# Altium footprint library eLIB.PcbLib: 206 footprints (part 8 of 13)
Each footprint in its own frame and in the unit in brackets; x right, y up, seen from the top. Pads: shape width x height; smd on the part's side, far side on the other; paste and mask are expansions set on the pad; w line width, h text height; cw(c..) or ccw(c..) is an arc to the next point about the centre after c.
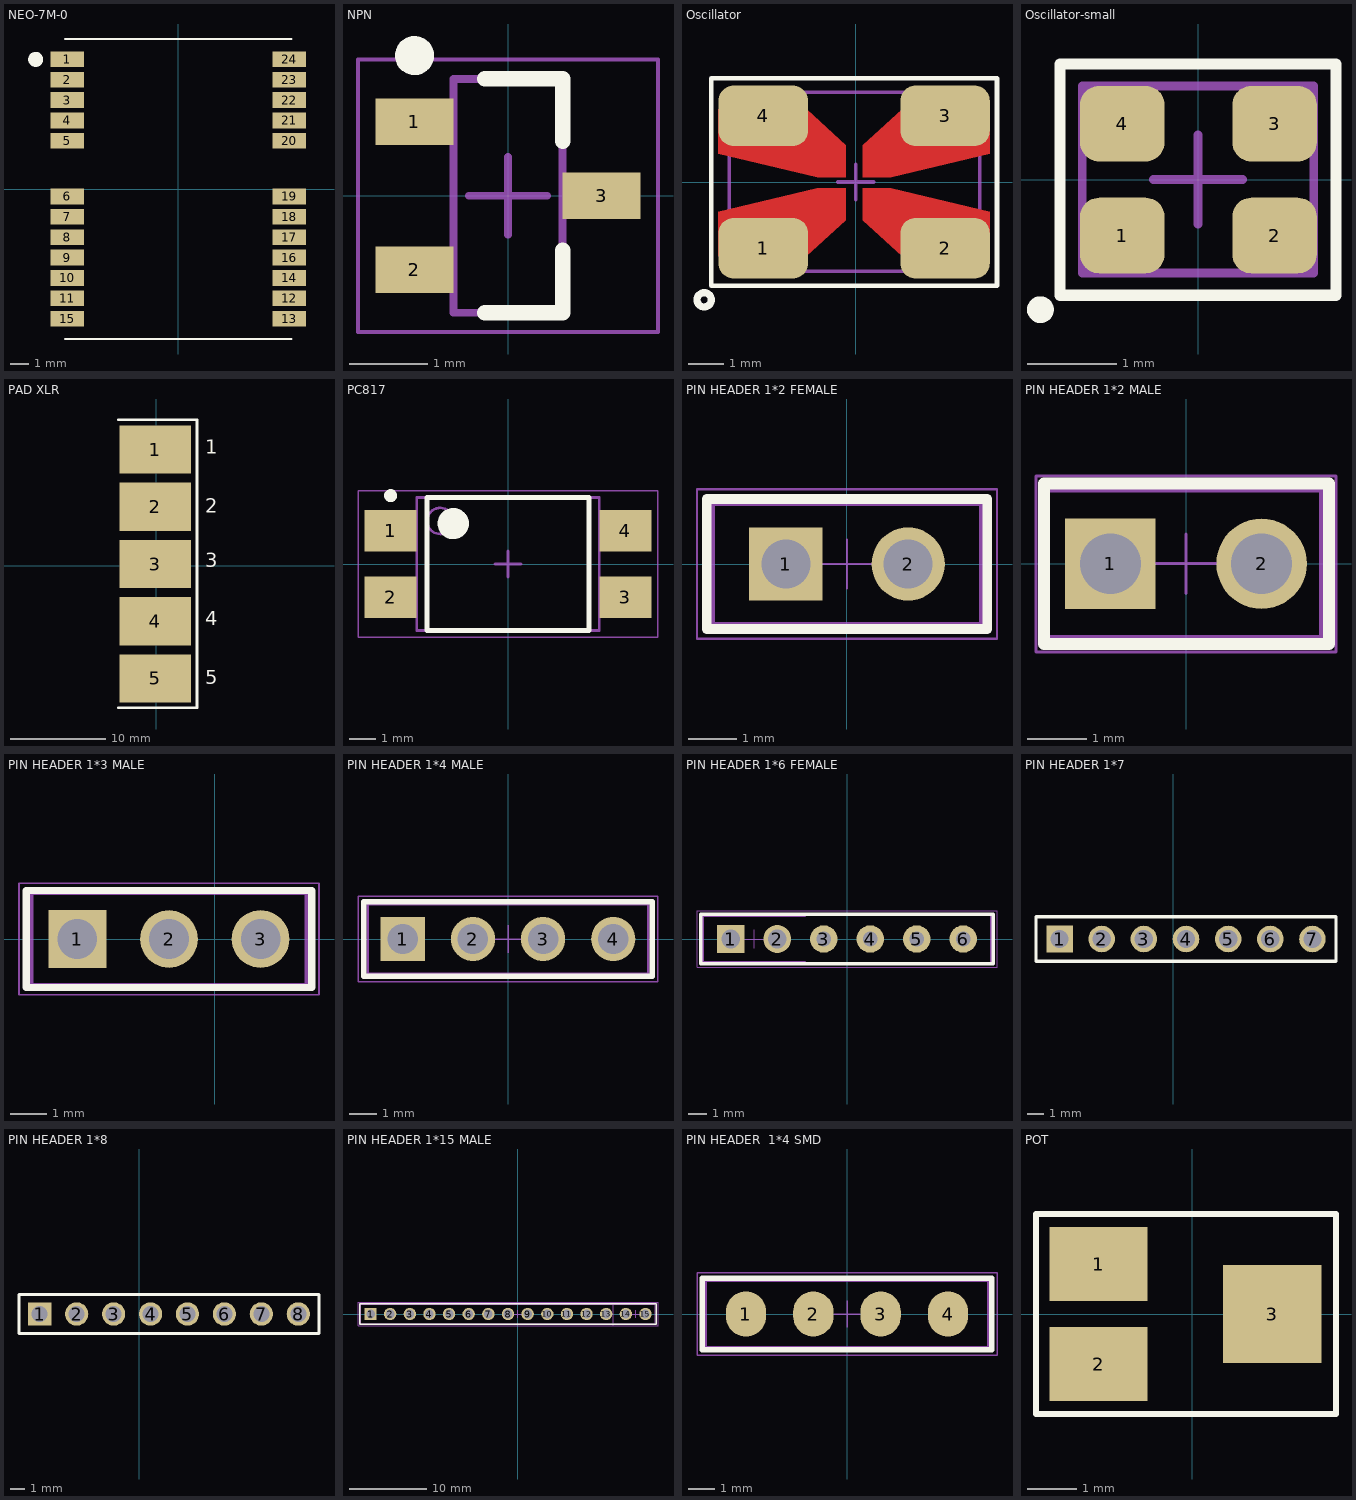
[diagram p7: the footprints below, top view; thin cyan lines are the x and y axes]

## NEO-7M-0 [mm] "unlox NEO-7M GPS"
pads (24):
  rect 1.8x0.85 smd: 1(-6,7) 2(-6,5.9) 3(-6,4.8) 4(-6,3.7) 5(-6,2.6) 6(-6,-0.4) 7(-6,-1.5) 8(-6,-2.6) 9(-6,-3.7) 10(-6,-4.8) 11(-6,-5.9) 12(6,-5.9) 13(6,-7) 14(6,-4.8) 15(-6,-7) 16(6,-3.7) 17(6,-2.6) 18(6,-1.5) 19(6,-0.4) 20(6,2.6) 21(6,3.7) 22(6,4.8) 23(6,5.9) 24(6,7)
Top Overlay:
  circle w0.406: c-7.7,7 r0.2
  lines w0.127: -6.1,-8.1 6.1,-8.1 ; -6.1,8.1 6.1,8.1
3D body "User Library-UBLOX_GPS_NEO-6M.STEP": height 2.64, standoff 0, extent -6.14,-8.31 6.22,8.29

## NPN [mm] "SOT23, 3-Leads, Body 2.90x2.45mm, Pitch 0.95mm, IPC Medium Density"
height 1.1
pads (3):
  rect 1x0.6 smd: 1(-1.2,0.95) 2(-1.2,-0.95) 3(1.2,0)
Top Overlay:
  circle w0.25: c-1.2,1.8 r0.125
  lines w0.2: -0.3,-1.5 0.7,-1.5 0.7,-0.7 ; -0.3,1.5 0.7,1.5 0.7,0.7
Mechanical 13:
  lines w0.1: -0.7,-1.5 -0.7,1.5 0.7,1.5 0.7,-1.5 -0.7,-1.5
Mechanical 15:
  lines w0.05: -1.925,-1.75 -1.925,1.75 1.925,1.75 1.925,-1.75 -1.925,-1.75
  lines w0.1: -0.5,0 0.5,0 ; 0,-0.5 0,0.5
3D body: height 1.1, standoff 0.05, extent -0.7,-1.5 0.7,1.5

## Oscillator [mm] "SMD Crystal OscillatorsCMOS  Output  7.0 x 5.0 x 1.3 mm 7W Series"
height 0.45
pads (4):
  rrect50% 2.5x1.7 smd: 1(-2.58,-1.85) 2(2.5,-1.85) 3(2.5,1.85) 4(-2.58,1.85)
Top Layer:
  region: -3.83,0.792 -1.07,0.13 -0.27,0.13 -0.27,1.03 -1.37,2.03 -3.83,2.03
  region: -3.83,-0.83 -1.08,-0.17 -0.28,-0.17 -0.28,-1.07 -1.38,-2.07 -3.83,-2.07
  region: 3.75,-0.83 1,-0.17 0.2,-0.17 0.2,-1.07 1.3,-2.07 3.75,-2.07
  region: 3.75,0.79 1,0.13 0.2,0.13 0.2,1.03 1.3,2.03 3.75,2.03
Top Overlay:
  circle w0.2: c-4.23,-3.29 r0.2
  lines w0.127: -4.03,-2.9 3.95,-2.9 3.95,2.9 -4.03,2.9 -4.03,-2.9
Mechanical 13:
  circle w0.1: c-2.93,-1.89 r0.3
  lines w0.1: -3.53,-2.49 3.47,-2.49 3.47,2.51 -3.53,2.51 -3.53,-2.49
Mechanical 15:
  lines w0.1: -0.5,0 0.5,0 ; 0,-0.5 0,0.5
3D body "User Library-CTS-CB3_7x5.step": height 1.71, standoff 0, extent -3.53,-2.49 3.47,2.51

## Oscillator-small [mm]
height 0.9
pads (4):
  rrect50% 0.95x0.85 smd: 1(-0.85,-0.628) 2(0.86,-0.628) 3(0.86,0.629) 4(-0.85,0.629)
Top Overlay:
  circle w0.2: c-1.77,-1.46 r0.05
  lines w0.127: -1.55,-1.3 1.55,-1.3 1.55,1.3 -1.55,1.3 -1.55,-1.3
Mechanical 13:
  lines w0.1: -1.3,-1.05 -1.3,1.05 1.3,1.05 1.3,-1.05 -1.3,-1.05
Mechanical 15:
  lines w0.1: -0.5,0 0.5,0 ; 0,-0.5 0,0.5
3D body: height 0.9, standoff 0, extent -1.3,-1.05 1.3,1.05

## PAD XLR [mm]
pads (5):
  rect 7.5x5.08 smd: 1(-0.132,12.25) 2(-0.132,6.22) 3(-0.132,0.19) 4(-0.132,-5.84) 5(-0.132,-11.87)
Top Overlay:
  lines w0.3: -3.993,-14.961 4.262,-14.961 4.262,15.392 -3.993,15.392
  text "5" at 5.14,-12.47 h1.5
  text "4" at 5.14,-6.29 h1.5
  text "3" at 5.14,-0.13 h1.5
  text "2" at 5.14,5.6 h1.5
  text "1" at 5.14,11.81 h1.5

## PC817 [mm] "PC817 optocoupler"
height 3.46
pads (4):
  rect 2x1.6 smd: 1(-4.5,1.27) 2(-4.5,-1.27) 3(4.5,-1.27) 4(4.5,1.27)
Top Overlay:
  circle w0.25: c-4.5,2.62 r0.125
  circle w0.6: c-2.1,1.55 r0.3
  lines w0.2: -3.1,-2.55 -3.1,2.55 3.1,2.55 3.1,-2.55 -3.1,-2.55
Mechanical 13:
  circle w0.1: c-2.6,1.65 r0.5
  lines w0.1: -3.5,-2.55 -3.5,2.55 3.5,2.55 3.5,-2.55 -3.5,-2.55
Mechanical 15:
  lines w0.05: -5.75,-2.8 -5.75,2.8 5.75,2.8 5.75,-2.8 -5.75,-2.8
  lines w0.1: -0.5,0 0.5,0 ; 0,-0.5 0,0.5
3D body "User Library-PC817_Gullwing.STEP": height -0.9, standoff -4.75, extent -5.15,-2.3 4.85,2.28

## PIN HEADER 1*2 FEMALE [mm] "Socket Header, Pitch 2.54 mm, THT, Vertical, single row, 2p"
pads (2):
  rect 1.52x1.52 hole 1.02: 1(-1.27,0)
  round 1.52 hole 1.02: 2(1.27,0)
Top Overlay:
  lines w0.2: -2.915,-1.35 -2.915,1.35 2.915,1.35 2.915,-1.35 -2.915,-1.35
Mechanical 13:
  lines w0.1: -2.79,-1.25 -2.79,1.25 2.79,1.25 2.79,-1.25 -2.79,-1.25
Mechanical 15:
  lines w0.05: -0.5,0 0.5,0 ; 0,-0.5 0,0.5 ; -3.115,-1.55 -3.115,1.55 3.115,1.55 3.115,-1.55 -3.115,-1.55
3D body "61300211821.stp": height 8.55, standoff -3.06, extent -2.79,-1.25 2.79,1.25

## PIN HEADER 1*2 MALE [mm] "Socket Header, Pitch 2.54 mm, THT, Vertical, single row, 2p"
pads (2):
  rect 1.52x1.52 hole 1.02: 1(-1.27,0)
  round 1.52 hole 1.02: 2(1.27,0)
Top Overlay:
  lines w0.2: -2.387,-1.35 2.4,-1.35 2.4,1.35 -2.387,1.35 -2.387,-1.35
Mechanical 13:
  lines w0.1: -2.42,-1.25 2.287,-1.25 2.287,1.25 -2.42,1.25 -2.42,-1.25
Mechanical 15:
  lines w0.05: -0.5,0 0.5,0 ; 0,-0.5 0,0.5 ; -2.52,-1.48 2.52,-1.48 2.52,1.47 -2.52,1.47 -2.52,-1.48
3D body "Pin header 2 way 1 row 2.54mm pitch.STEP": height 8.34, standoff -2.08, extent -2.387,-1.18 2.287,1.16

## PIN HEADER 1*3 MALE [mm] "Pin Header, pitch 2.54 mm, THT, Vertical, single row, 4p"
height 8.54
pads (3):
  rect 1.6x1.6 hole 1.1: 1(-3.81,0)
  round 1.6 hole 1.1: 2(-1.27,0) 3(1.27,0)
Top Overlay:
  lines w0.2: -5.23,-1.345 -5.23,1.345 2.69,1.345 2.69,-1.345 -5.23,-1.345
Mechanical 13:
  lines w0.1: -5.08,-1.27 2.54,-1.27 2.54,1.27 -5.08,1.27 -5.08,-1.27
Mechanical 15:
  lines w0.05: -5.43,-1.545 2.89,-1.545 2.89,1.545 -5.43,1.545 -5.43,-1.545
3D body "Pin header 2 way 1 row 2.54mm pitch.STEP": height 8.34, standoff -2.08, extent -4.927,-1.18 -0.253,1.16
3D body "Pin header 2 way 1 row 2.54mm pitch.STEP": height 8.34, standoff -2.08, extent -2.287,-1.18 2.387,1.16

## PIN HEADER 1*4 MALE [mm] "Pin Header, pitch 2.54 mm, THT, Vertical, single row, 4p"
height 8.54
pads (4):
  rect 1.6x1.6 hole 1.1: 1(-3.81,0)
  round 1.6 hole 1.1: 2(-1.27,0) 3(1.27,0) 4(3.81,0)
Top Overlay:
  lines w0.2: -5.23,-1.345 5.23,-1.345 5.23,1.345 -5.23,1.345 -5.23,-1.345
Mechanical 13:
  lines w0.1: -5.08,-1.27 -5.08,1.27 5.08,1.27 5.08,-1.27 -5.08,-1.27
Mechanical 15:
  lines w0.05: -0.5,0 0.5,0 ; 0,-0.5 0,0.5 ; -5.43,-1.545 -5.43,1.545 5.43,1.545 5.43,-1.545 -5.43,-1.545
3D body "61300411121.stp": height 8.57, standoff -2.97, extent -5.08,-1.27 5.08,1.27

## PIN HEADER 1*6 FEMALE [mm] "Socket Header, Pitch 2.54 mm, THT, Vertical, single row, 6p"
pads (6):
  rect 1.52x1.52 hole 1.02: 1(-6.35,0)
  round 1.52 hole 1.02: 2(-3.81,0)
  round 1.5 hole 0.8: 3(-1.27,0) 4(1.27,0) 5(3.81,0) 6(6.35,0)
Top Overlay:
  lines w0.2: -7.995,-1.35 7.995,-1.35 7.995,1.35 -7.995,1.35 -7.995,-1.35
Mechanical 13:
  lines w0.1: -2.29,-1.25 -7.87,-1.25 -7.87,1.25 -2.29,1.25 ; 7.87,-1.25 7.87,1.25
Mechanical 15:
  lines w0.05: -5.58,0 -4.58,0 ; -5.08,-0.5 -5.08,0.5 ; -8.195,-1.55 8.195,-1.55 8.195,1.55 -8.195,1.55 -8.195,-1.55
3D body "61300211821.stp": height 8.55, standoff -3.06, extent 2.29,-1.25 7.87,1.25
3D body "61300211821.stp": height 8.55, standoff -3.06, extent -2.79,-1.25 2.79,1.25
3D body "61300211821.stp": height 8.55, standoff -3.06, extent -7.87,-1.25 -2.29,1.25

## PIN HEADER 1*7 [mm] "Pin Header, pitch 2.54 mm, THT, Vertical, single row, 16p"
height 8.54
pads (7):
  rect 1.6x1.6 hole 1.1: 1(-6.85,-13.81)
  round 1.6 hole 1.1: 2(-4.31,-13.81) 3(-1.77,-13.81) 4(0.77,-13.81) 5(3.31,-13.81) 6(5.85,-13.81) 7(8.39,-13.81)
Top Overlay:
  lines w0.2: -8.27,-15.155 -8.27,-12.465 9.81,-12.465 9.81,-15.155 -8.27,-15.155
3D body "61300411121.stp": height 8.57, standoff -2.97, extent -0.56,-15.05 9.6,-12.51
3D body "61300411121.stp": height 8.57, standoff -2.97, extent -8.18,-15.05 1.98,-12.51

## PIN HEADER 1*8 [mm] "Pin Header, pitch 2.54 mm, THT, Vertical, single row, 16p"
height 8.54
pads (8):
  rect 1.6x1.6 hole 1.1: 1(-6.85,-13.81)
  round 1.6 hole 1.1: 2(-4.31,-13.81) 3(-1.77,-13.81) 4(0.77,-13.81) 5(3.31,-13.81) 6(5.85,-13.81) 7(8.39,-13.81) 8(10.93,-13.81)
Top Overlay:
  lines w0.2: -8.27,-15.155 12.35,-15.155 12.35,-12.465 -8.27,-12.465 -8.27,-15.155
3D body "61300411121.stp": height 8.57, standoff -2.97, extent -8.18,-15.05 1.98,-12.51
3D body "61300411121.stp": height 8.57, standoff -2.97, extent 1.98,-15.05 12.14,-12.51

## PIN HEADER 1*15 MALE [mm] "Pin Header, pitch 2.54 mm, THT, Vertical, single row, 16p"
height 8.54
pads (15):
  rect 1.6x1.6 hole 1.1: 1(-19.05,0)
  round 1.6 hole 1.1: 2(-16.51,0) 3(-13.97,0) 4(-11.43,0) 5(-8.89,0) 6(-6.35,0) 7(-3.81,0) 8(-1.27,0) 9(1.27,0) 10(3.81,0) 11(6.35,0) 12(8.89,0) 13(11.43,0) 14(13.97,0) 15(16.51,0)
Top Overlay:
  lines w0.2: 12.55,-1.345 17.93,-1.345 17.93,1.345 12.55,1.345 ; 17.78,-1.345 -20.47,-1.345 -20.47,1.345 17.78,1.345
Mechanical 13:
  lines w0.1: 12.7,-1.27 17.78,-1.27 17.78,1.27 12.7,1.27 ; 17.75,-1.27 -20.32,-1.27 -20.32,1.27 17.75,1.27
Mechanical 15:
  lines w0.05: -0.5,0 0.5,0 ; 0,-0.5 0,0.5 ; 14.74,0 15.74,0 ; 15.24,-0.5 15.24,0.5 ; 18.13,-1.545 -20.67,-1.545 -20.67,1.545 18.13,1.545 ; 18.13,-1.545 18.13,1.545 ; 18.13,-1.545 12.35,-1.545 12.35,1.545 18.13,1.545
3D body "61301611121.stp": height 8.57, standoff -2.97, extent -22.9,-1.28 17.74,1.26

## PIN HEADER  1*4 SMD [mm] "Socket Header, Pitch 2.54 mm, THT, Vertical, single row, 4p"
height 8.5
pads (4):
  oval 1.52x1.7 smd: 1(-3.81,0) 2(-1.27,0) 3(1.27,0) 4(3.81,0)
Top Overlay:
  lines w0.2: -5.455,-1.35 5.455,-1.35 5.455,1.35 -5.455,1.35 -5.455,-1.35
Mechanical 13:
  lines w0.1: -5.33,-1.25 5.33,-1.25 5.33,1.25 -5.33,1.25 -5.33,-1.25
Mechanical 15:
  lines w0.05: -0.5,0 0.5,0 ; 0,-0.5 0,0.5 ; -5.655,-1.55 5.655,-1.55 5.655,1.55 -5.655,1.55 -5.655,-1.55

## POT [mm]
pads (3):
  rect 2x1.5 smd: 1(-1.905,1.016) 2(-1.905,-1.016)
  rect 2x2 smd: 3(1.627,0)
Top Overlay:
  lines w0.127: -3.175,-2.032 -3.175,2.032 2.921,2.032 2.921,-2.032 -3.175,-2.032
3D body "POT SMD.stp": height 1.01, standoff -0.51, extent -2.13,-1.52 1.65,1.58